# Altium footprint library MYLIB.PcbLib: 600 footprints (part 15 of 39)
Each footprint in its own frame and in the unit in brackets; x right, y up, seen from the top. Pads: shape width x height; smd on the part's side, far side on the other; paste and mask are expansions set on the pad; w line width, h text height; cw(c..) or ccw(c..) is an arc to the next point about the centre after c.
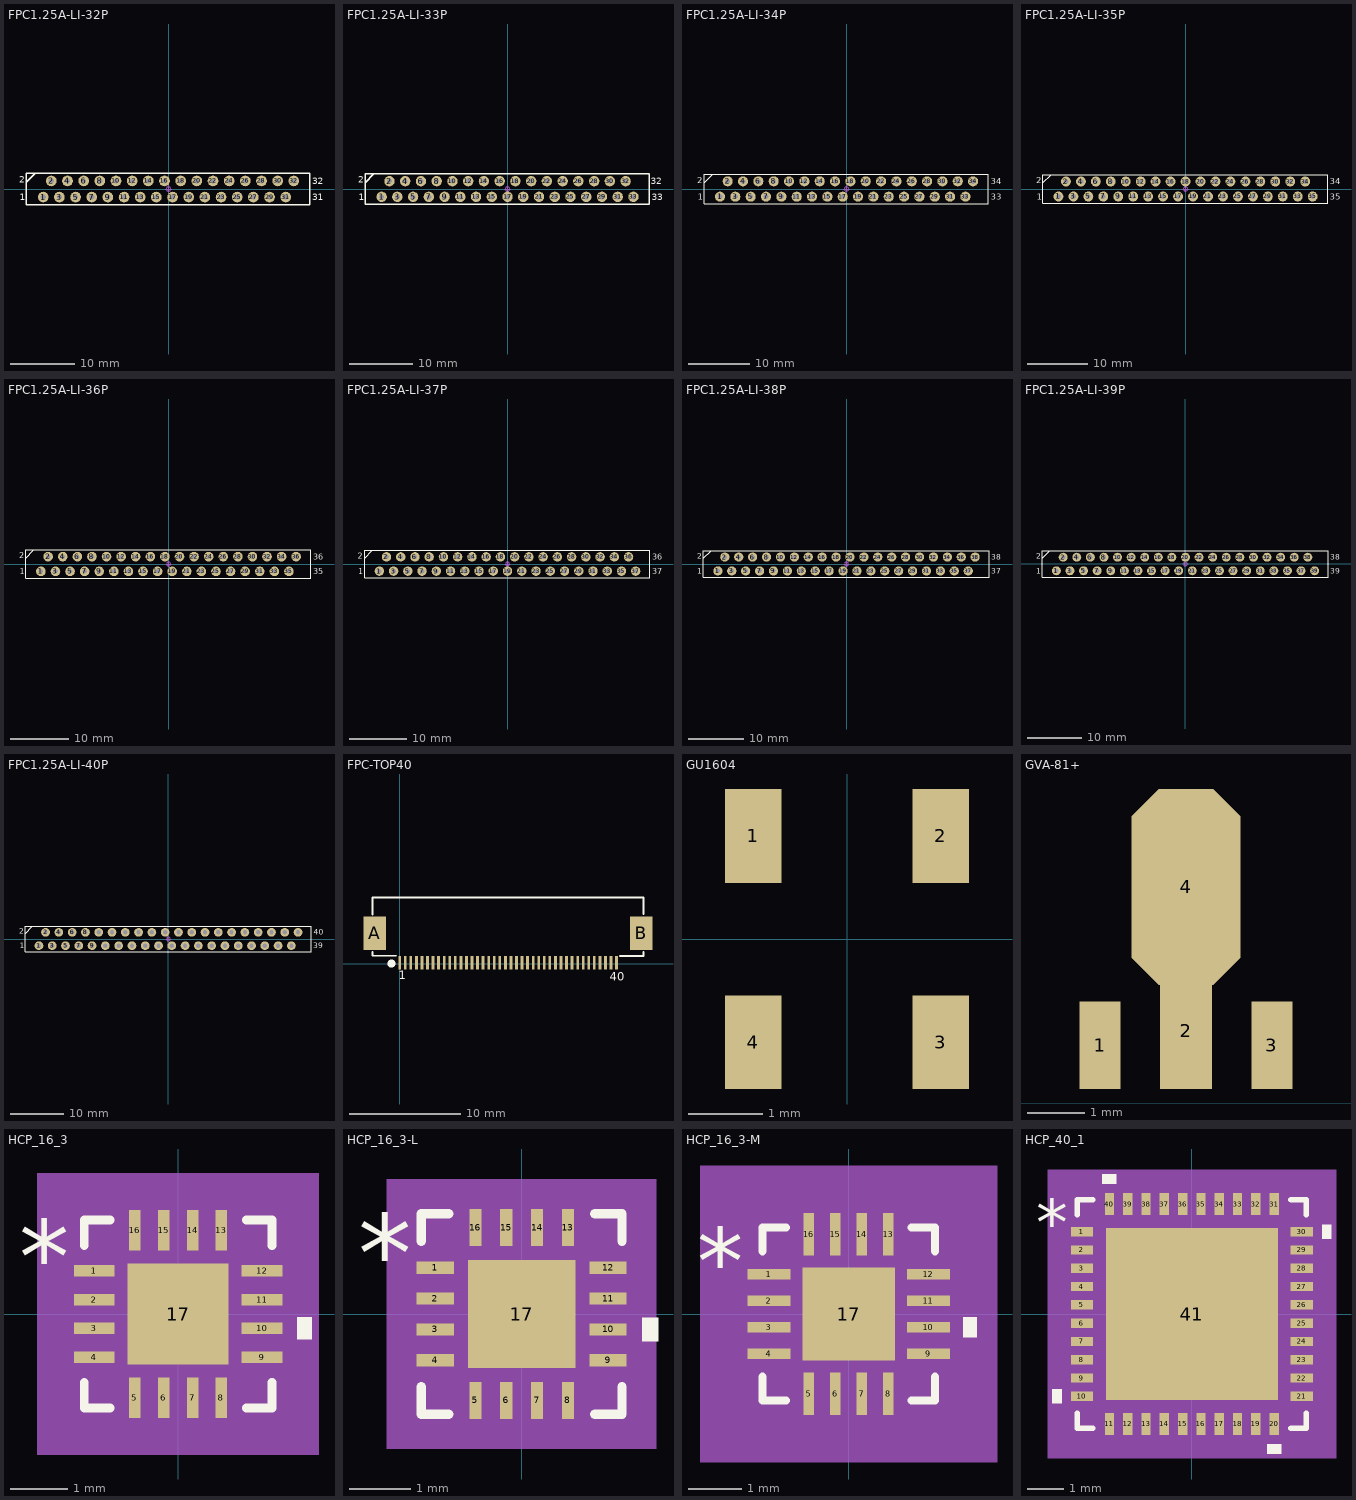
[diagram p14: the footprints below, top view; thin cyan lines are the x and y axes]

## FPC1.25A-LI-32P [mm] "32脚，长：43.5mm，宽：4.5mm，高：7.3mm"
pads (32):
  round 1.65 hole 0.8: 1(-19.375,-1.25) 2(-18.125,1.25) 3(-16.875,-1.25) 4(-15.625,1.25) 5(-14.375,-1.25) 6(-13.125,1.25) 7(-11.875,-1.25) 8(-10.625,1.25) 9(-9.375,-1.25) 10(-8.125,1.25) 11(-6.875,-1.25) 12(-5.625,1.25) 13(-4.375,-1.25) 14(-3.125,1.25) 15(-1.875,-1.25) 16(-0.625,1.25) 17(0.625,-1.25) 18(1.875,1.25) 19(3.125,-1.25) 20(4.375,1.25) 21(5.625,-1.25) 22(6.875,1.25) 23(8.125,-1.25) 24(9.375,1.25) 25(10.625,-1.25) 26(11.875,1.25) 27(13.125,-1.25) 28(14.375,1.25) 29(15.625,-1.25) 30(16.875,1.25) 31(18.125,-1.25) 32(19.375,1.25)
Top Overlay:
  lines w0.2: -21.981,1.016 -20.584,2.413 ; -21.981,-2.413 -21.981,2.413 21.875,2.413 21.875,-2.413 -21.981,-2.413
  text "31" at 22.256,-1.778 h1.02
  text "32" at 22.225,0.762 h1.02
  text "2" at -23.124,0.965 h1.02
  text "1" at -22.987,-1.778 h1.02
Mechanical 15:
  circle w0.05: c0,0 r0.35
  lines w0.05: -0.5,0 0.5,0 ; 0,-0.5 0,0.5
3D body "FPC1.25-DIP-32P.STEP": height 7.3, standoff -2.55, extent -21.8,-2.25 21.8,2.25

## FPC1.25A-LI-33P [mm] "33脚，长：44.75mm，宽：4.5mm，高：7.3mm"
pads (33):
  round 1.65 hole 0.8: 1(-20,-1.25) 2(-18.75,1.25) 3(-17.5,-1.25) 4(-16.25,1.25) 5(-15,-1.25) 6(-13.75,1.25) 7(-12.5,-1.25) 8(-11.25,1.25) 9(-10,-1.25) 10(-8.75,1.25) 11(-7.5,-1.25) 12(-6.25,1.25) 13(-5,-1.25) 14(-3.75,1.25) 15(-2.5,-1.25) 16(-1.25,1.25) 17(0,-1.25) 18(1.25,1.25) 19(2.5,-1.25) 20(3.75,1.25) 21(5,-1.25) 22(6.25,1.25) 23(7.5,-1.25) 24(8.75,1.25) 25(10,-1.25) 26(11.25,1.25) 27(12.5,-1.25) 28(13.75,1.25) 29(15,-1.25) 30(16.25,1.25) 31(17.5,-1.25) 32(18.75,1.25) 33(20,-1.25)
Top Overlay:
  lines w0.2: -22.606,1.016 -21.209,2.413 ; -22.606,-2.413 -22.606,2.413 22.5,2.413 22.5,-2.413 -22.606,-2.413
  text "33" at 22.881,-1.778 h1.02
  text "32" at 22.733,0.762 h1.02
  text "2" at -23.749,0.965 h1.02
  text "1" at -23.622,-1.778 h1.02
Mechanical 15:
  circle w0.05: c0,0 r0.35
  lines w0.05: -0.5,0 0.5,0 ; 0,-0.5 0,0.5
3D body "FPC1.25-DIP-33P.STEP": height 7.3, standoff -2.55, extent -22.425,-2.25 22.425,2.25

## FPC1.25A-LI-34P [mm] "34脚，长：46mm，宽：4.5mm，高：7.3mm"
pads (34):
  round 1.65 hole 0.8: 1(-20.625,-1.25) 2(-19.375,1.25) 3(-18.125,-1.25) 4(-16.875,1.25) 5(-15.625,-1.25) 6(-14.375,1.25) 7(-13.125,-1.25) 8(-11.875,1.25) 9(-10.625,-1.25) 10(-9.375,1.25) 11(-8.125,-1.25) 12(-6.875,1.25) 13(-5.625,-1.25) 14(-4.375,1.25) 15(-3.125,-1.25) 16(-1.875,1.25) 17(-0.625,-1.25) 18(0.625,1.25) 19(1.875,-1.25) 20(3.125,1.25) 21(4.375,-1.25) 22(5.625,1.25) 23(6.875,-1.25) 24(8.125,1.25) 25(9.375,-1.25) 26(10.625,1.25) 27(11.875,-1.25) 28(13.125,1.25) 29(14.375,-1.25) 30(15.625,1.25) 31(16.875,-1.25) 32(18.125,1.25) 33(19.375,-1.25) 34(20.625,1.25)
Top Overlay:
  lines w0.2: -23.231,1.016 -21.834,2.413 ; -23.231,-2.413 -23.231,2.413 23.125,2.413 23.125,-2.413 -23.231,-2.413
  text "33" at 23.506,-1.778 h1.02
  text "34" at 23.495,0.762 h1.02
  text "2" at -24.374,0.965 h1.02
  text "1" at -24.257,-1.778 h1.02
Mechanical 15:
  circle w0.05: c0,0 r0.35
  lines w0.05: -0.5,0 0.5,0 ; 0,-0.5 0,0.5
3D body "FPC1.25-DIP-34P.STEP": height 7.3, standoff -2.55, extent -23.05,-2.25 23.05,2.25

## FPC1.25A-LI-35P [mm] "35脚，长：47.25mm，宽：4.5mm，高：7.3mm"
pads (35):
  round 1.65 hole 0.8: 1(-21.25,-1.25) 2(-20,1.25) 3(-18.75,-1.25) 4(-17.5,1.25) 5(-16.25,-1.25) 6(-15,1.25) 7(-13.75,-1.25) 8(-12.5,1.25) 9(-11.25,-1.25) 10(-10,1.25) 11(-8.75,-1.25) 12(-7.5,1.25) 13(-6.25,-1.25) 14(-5,1.25) 15(-3.75,-1.25) 16(-2.5,1.25) 17(-1.25,-1.25) 18(0,1.25) 19(1.25,-1.25) 20(2.5,1.25) 21(3.75,-1.25) 22(5,1.25) 23(6.25,-1.25) 24(7.5,1.25) 25(8.75,-1.25) 26(10,1.25) 27(11.25,-1.25) 28(12.5,1.25) 29(13.75,-1.25) 30(15,1.25) 31(16.25,-1.25) 32(17.5,1.25) 33(18.75,-1.25) 34(20,1.25) 35(21.25,-1.25)
Top Overlay:
  lines w0.2: -23.856,1.016 -22.459,2.413 ; -23.856,-2.413 23.75,-2.413 23.75,2.413 -23.856,2.413 -23.856,-2.413
  text "1" at -24.892,-1.778 h1.02
  text "2" at -24.999,0.965 h1.02
  text "34" at 24.13,0.762 h1.02
  text "35" at 24.131,-1.778 h1.02
Mechanical 15:
  circle w0.05: c0,0 r0.35
  lines w0.05: -0.5,0 0.5,0 ; 0,-0.5 0,0.5
3D body "FPC1.25-DIP-35P.STEP": height 7.3, standoff -2.55, extent -23.675,-2.25 23.675,2.25

## FPC1.25A-LI-36P [mm] "36脚，长：48.5mm，宽：4.5mm，高：7.3mm"
pads (36):
  round 1.65 hole 0.8: 1(-21.875,-1.25) 2(-20.625,1.25) 3(-19.375,-1.25) 4(-18.125,1.25) 5(-16.875,-1.25) 6(-15.625,1.25) 7(-14.375,-1.25) 8(-13.125,1.25) 9(-11.875,-1.25) 10(-10.625,1.25) 11(-9.375,-1.25) 12(-8.125,1.25) 13(-6.875,-1.25) 14(-5.625,1.25) 15(-4.375,-1.25) 16(-3.125,1.25) 17(-1.875,-1.25) 18(-0.625,1.25) 19(0.625,-1.25) 20(1.875,1.25) 21(3.125,-1.25) 22(4.375,1.25) 23(5.625,-1.25) 24(6.875,1.25) 25(8.125,-1.25) 26(9.375,1.25) 27(10.625,-1.25) 28(11.875,1.25) 29(13.125,-1.25) 30(14.375,1.25) 31(15.625,-1.25) 32(16.875,1.25) 33(18.125,-1.25) 34(19.375,1.25) 35(20.625,-1.25) 36(21.875,1.25)
Top Overlay:
  lines w0.2: -24.481,1.016 -23.084,2.413 ; -24.481,-2.413 24.375,-2.413 24.375,2.413 -24.481,2.413 -24.481,-2.413
  text "1" at -25.527,-1.778 h1.02
  text "2" at -25.624,0.965 h1.02
  text "36" at 24.765,0.762 h1.02
  text "35" at 24.756,-1.778 h1.02
Mechanical 15:
  circle w0.05: c0,0 r0.35
  lines w0.05: -0.5,0 0.5,0 ; 0,-0.5 0,0.5
3D body "FPC1.25-DIP-36P.STEP": height 7.3, standoff -2.55, extent -24.3,-2.25 24.3,2.25

## FPC1.25A-LI-37P [mm] "37脚，长：48.75mm，宽：4.5mm，高：7.3mm"
pads (37):
  round 1.65 hole 0.8: 1(-22.5,-1.25) 2(-21.25,1.25) 3(-20,-1.25) 4(-18.75,1.25) 5(-17.5,-1.25) 6(-16.25,1.25) 7(-15,-1.25) 8(-13.75,1.25) 9(-12.5,-1.25) 10(-11.25,1.25) 11(-10,-1.25) 12(-8.75,1.25) 13(-7.5,-1.25) 14(-6.25,1.25) 15(-5,-1.25) 16(-3.75,1.25) 17(-2.5,-1.25) 18(-1.25,1.25) 19(0,-1.25) 20(1.25,1.25) 21(2.5,-1.25) 22(3.75,1.25) 23(5,-1.25) 24(6.25,1.25) 25(7.5,-1.25) 26(8.75,1.25) 27(10,-1.25) 28(11.25,1.25) 29(12.5,-1.25) 30(13.75,1.25) 31(15,-1.25) 32(16.25,1.25) 33(17.5,-1.25) 34(18.75,1.25) 35(20,-1.25) 36(21.25,1.25) 37(22.5,-1.25)
Top Overlay:
  lines w0.2: -25.106,1.016 -23.709,2.413 ; -25.106,-2.413 25,-2.413 25,2.413 -25.106,2.413 -25.106,-2.413
  text "1" at -26.162,-1.778 h1.02
  text "2" at -26.249,0.965 h1.02
  text "36" at 25.4,0.762 h1.02
  text "37" at 25.381,-1.778 h1.02
Mechanical 15:
  circle w0.05: c0,0 r0.35
  lines w0.05: -0.5,0 0.5,0 ; 0,-0.5 0,0.5
3D body "FPC1.25-DIP-37P.STEP": height 7.3, standoff -2.55, extent -24.925,-2.25 24.925,2.25

## FPC1.25A-LI-38P [mm] "38脚，长：51mm，宽：4.5mm，高：7.3mm"
pads (38):
  round 1.65 hole 0.8: 1(-23.125,-1.25) 2(-21.875,1.25) 3(-20.625,-1.25) 4(-19.375,1.25) 5(-18.125,-1.25) 6(-16.875,1.25) 7(-15.625,-1.25) 8(-14.375,1.25) 9(-13.125,-1.25) 10(-11.875,1.25) 11(-10.625,-1.25) 12(-9.375,1.25) 13(-8.125,-1.25) 14(-6.875,1.25) 15(-5.625,-1.25) 16(-4.375,1.25) 17(-3.125,-1.25) 18(-1.875,1.25) 19(-0.625,-1.25) 20(0.625,1.25) 21(1.875,-1.25) 22(3.125,1.25) 23(4.375,-1.25) 24(5.625,1.25) 25(6.875,-1.25) 26(8.125,1.25) 27(9.375,-1.25) 28(10.625,1.25) 29(11.875,-1.25) 30(13.125,1.25) 31(14.375,-1.25) 32(15.625,1.25) 33(16.875,-1.25) 34(18.125,1.25) 35(19.375,-1.25) 36(20.625,1.25) 37(21.875,-1.25) 38(23.125,1.25)
Top Overlay:
  lines w0.2: -25.731,1.016 -24.334,2.413 ; -25.731,-2.413 25.625,-2.413 25.625,2.413 -25.731,2.413 -25.731,-2.413
  text "1" at -26.797,-1.778 h1.02
  text "2" at -26.874,0.965 h1.02
  text "38" at 26.035,0.762 h1.02
  text "37" at 26.006,-1.778 h1.02
Mechanical 15:
  circle w0.05: c0,0 r0.35
  lines w0.05: -0.5,0 0.5,0 ; 0,-0.5 0,0.5
3D body "FPC1.25-DIP-38P.STEP": height 7.3, standoff -2.55, extent -25.55,-2.25 25.55,2.25

## FPC1.25A-LI-39P [mm] "39脚，长：52.5mm，宽：4.5mm，高：7.3mm"
pads (39):
  round 1.65 hole 0.8: 1(-23.75,-1.25) 2(-22.5,1.25) 3(-21.25,-1.25) 4(-20,1.25) 5(-18.75,-1.25) 6(-17.5,1.25) 7(-16.25,-1.25) 8(-15,1.25) 9(-13.75,-1.25) 10(-12.5,1.25) 11(-11.25,-1.25) 12(-10,1.25) 13(-8.75,-1.25) 14(-7.5,1.25) 15(-6.25,-1.25) 16(-5,1.25) 17(-3.75,-1.25) 18(-2.5,1.25) 19(-1.25,-1.25) 20(0,1.25) 21(1.25,-1.25) 22(2.5,1.25) 23(3.75,-1.25) 24(5,1.25) 25(6.25,-1.25) 26(7.5,1.25) 27(8.75,-1.25) 28(10,1.25) 29(11.25,-1.25) 30(12.5,1.25) 31(13.75,-1.25) 32(15,1.25) 33(16.25,-1.25) 34(17.5,1.25) 35(18.75,-1.25) 36(20,1.25) 37(21.25,-1.25) 38(22.5,1.25) 39(23.75,-1.25)
Top Overlay:
  lines w0.2: -26.356,1.016 -24.959,2.413 ; -26.356,-2.413 26.25,-2.413 26.25,2.413 -26.356,2.413 -26.356,-2.413
  text "1" at -27.432,-1.778 h1.02
  text "2" at -27.499,0.965 h1.02
  text "38" at 26.67,0.762 h1.02
  text "39" at 26.631,-1.778 h1.02
Mechanical 15:
  circle w0.05: c0,0 r0.35
  lines w0.05: -0.5,0 0.5,0 ; 0,-0.5 0,0.5
3D body "FPC1.25-DIP-39P.STEP": height 7.3, standoff -2.55, extent -26.175,-2.25 26.175,2.25

## FPC1.25A-LI-40P [mm] "40脚，长：53.5mm，宽：4.5mm，高：7.3mm"
pads (40):
  round 1.65 hole 0.8: 1(-24.375,-1.25) 2(-23.125,1.25) 3(-21.875,-1.25) 4(-20.625,1.25) 5(-19.375,-1.25) 6(-18.125,1.25) 7(-16.875,-1.25) 8(-15.625,1.25) 9(-14.375,-1.25) 10(-13.125,1.25) 11(-11.875,-1.25) 12(-10.625,1.25) 13(-9.375,-1.25) 14(-8.125,1.25) 15(-6.875,-1.25) 16(-5.625,1.25) 17(-4.375,-1.25) 18(-3.125,1.25) 19(-1.875,-1.25) 20(-0.625,1.25) 21(0.625,-1.25) 22(1.875,1.25) 23(3.125,-1.25) 24(4.375,1.25) 25(5.625,-1.25) 26(6.875,1.25) 27(8.125,-1.25) 28(9.375,1.25) 29(10.625,-1.25) 30(11.875,1.25) 31(13.125,-1.25) 32(14.375,1.25) 33(15.625,-1.25) 34(16.875,1.25) 35(18.125,-1.25) 36(19.375,1.25) 37(20.625,-1.25) 38(21.875,1.25) 39(23.125,-1.25) 40(24.375,1.25)
Top Overlay:
  lines w0.2: -26.981,1.016 -25.584,2.413 ; -26.981,-2.413 26.875,-2.413 26.875,2.413 -26.981,2.413 -26.981,-2.413
  text "1" at -27.94,-1.778 h1.02
  text "2" at -28.124,0.965 h1.02
  text "40" at 27.305,0.762 h1.02
  text "39" at 27.256,-1.778 h1.02
Mechanical 15:
  circle w0.05: c0,0 r0.35
  lines w0.05: -0.5,0 0.5,0 ; 0,-0.5 0,0.5
3D body "FPC1.25-DIP-40P.STEP": height 7.3, standoff -2.55, extent -26.8,-2.25 26.8,2.25

## FPC-TOP40 [mm]
pads (42):
  rect 0.25x1.2 smd: 1(0,0.102) 2(0.5,0.102) 3(1,0.102) 4(1.5,0.102) 5(2,0.102) 6(2.5,0.102) 7(3,0.102) 8(3.5,0.102) 9(4,0.102) 10(4.5,0.102) 11(5,0.102) 12(5.5,0.102) 13(6,0.102) 14(6.5,0.102) 15(7,0.102) 16(7.5,0.102) 17(8,0.102) 18(8.5,0.102) 19(9,0.102) 20(9.5,0.102) 21(10,0.102) 22(10.5,0.102) 23(11,0.102) 24(11.5,0.102) 25(12,0.102) 26(12.5,0.102) 27(13,0.102) 28(13.5,0.102) 29(14,0.102) 30(14.5,0.102) 31(15,0.102) 32(15.5,0.102) 33(16,0.102) 34(16.5,0.102) 35(17,0.102) 36(17.5,0.102) 37(18,0.102) 38(18.5,0.102) 39(19,0.102) 40(19.5,0.102)
  rect 2x3 smd: A(-2.25,2.754) B(21.725,2.754)
Top Overlay:
  circle w0.356: c-0.737,0.025 r0.178
  lines w0.127: -2.45,0.731 -2.438,0.719
  lines w0.152: -2.45,0.719 -0.305,0.719 ; -2.45,0.731 -2.45,1.067 ; -2.45,4.445 -2.45,5.969 21.925,5.969 21.925,4.47 ; 19.794,0.711 21.925,0.711 21.925,1.067
  text "40" at 18.898,-1.499 h0.76
  text "1" at -0.102,-1.397 h0.76

## GU1604 [mil]
pads (4):
  rect 30x50 smd: 1(-50,55) 2(50,55) 3(50,-55) 4(-50,-55)

## GVA-81+ [mil] "5V"
height 62.99
pads (4):
  rect 28x60 smd: 1(80,40) 3(198,40)
  rect 36x80 smd: 2(139,50)
  oct 75x134.5 smd: 4(139,148.62)

## HCP_16_3 [mm]
pads (17):
  rect 0.705x0.198 smd paste+0 mask+0: 1(-1.452,0.75) 2(-1.452,0.25) 3(-1.452,-0.25) 4(-1.452,-0.75) 9(1.452,-0.75) 10(1.452,-0.25) 11(1.452,0.25) 12(1.452,0.75)
  rect 0.198x0.705 smd paste+0 mask+0: 5(-0.75,-1.452) 6(-0.25,-1.452) 7(0.25,-1.452) 8(0.75,-1.452) 13(0.75,1.452) 14(0.25,1.452) 15(-0.25,1.452) 16(-0.75,1.452)
  rect 1.75x1.75 smd paste-0.862 mask+0: 17(0,0)
Top Overlay:
  region: 2.059,-0.059 2.313,-0.059 2.313,-0.44 2.059,-0.44
  lines w0.152: -1.627,-1.182 -1.627,-1.627 -1.182,-1.627 ; -1.627,1.182 -1.627,1.627 -1.182,1.627 ; 1.182,-1.627 1.627,-1.627 1.627,-1.182 ; 1.182,1.627 1.627,1.627 1.627,1.182
  text "*" at -2.757,0.365 h1.27
Top Paste:
  region: 0.875,0.875 -0.875,0.875 -0.875,-0.875 0.875,-0.875
Mechanical 5:
  region: 2.44,-2.44 -2.44,-2.44 -2.44,2.44 2.44,2.44
Mechanical 13:
  lines w0.025: -1.5,0.23 -0.23,1.5 ; -1.5,-1.5 -1.5,1.5 1.5,1.5 1.5,-1.5 -1.5,-1.5 ; -1.5,-0.9 -1.5,-0.6 -1.5,-0.9 ; -1.5,-0.4 -1.5,-0.1 -1.5,-0.4 ; -1.5,0.1 -1.5,0.4 -1.5,0.1 ; -1.5,0.6 -1.5,0.9 -1.5,0.6 ; -0.9,-1.5 -0.6,-1.5 -0.9,-1.5 ; -0.9,1.5 -0.6,1.5 -0.9,1.5 ; -0.4,-1.5 -0.1,-1.5 -0.4,-1.5 ; -0.4,1.5 -0.1,1.5 -0.4,1.5 ; 0.1,-1.5 0.4,-1.5 0.1,-1.5 ; 0.1,1.5 0.4,1.5 0.1,1.5 ; 0.6,-1.5 0.9,-1.5 0.6,-1.5 ; 0.6,1.5 0.9,1.5 0.6,1.5 ; 1.5,-0.9 1.5,-0.6 1.5,-0.9 ; 1.5,-0.4 1.5,-0.1 1.5,-0.4 ; 1.5,0.1 1.5,0.4 1.5,0.1 ; 1.5,0.6 1.5,0.9 1.5,0.6
  text "*" at -1.418,0.365 h1.27
Mechanical 15:
  region: -1.103,-1.754 -1.754,-1.754 -1.754,-1.103 -2.059,-1.103 -2.059,1.103 -1.754,1.103 -1.754,1.754 -1.103,1.754 -1.103,2.059 1.103,2.059 1.103,1.754 1.754,1.754 1.754,1.103 2.059,1.103 2.059,-1.103 1.754,-1.103 1.754,-1.754 1.103,-1.754 1.103,-2.059 -1.103,-2.059
  lines w0.152: -2.059,-1.103 -2.059,1.103 -1.754,1.103 -1.754,1.754 -1.103,1.754 -1.103,2.059 1.103,2.059 1.103,1.754 1.754,1.754 1.754,1.103 2.059,1.103 2.059,-1.103 1.754,-1.103 1.754,-1.754 1.103,-1.754 1.103,-2.059 -1.103,-2.059 -1.103,-1.754 -1.754,-1.754 -1.754,-1.103 -2.059,-1.103
3D body: height 0.25, standoff 0, extent 0,0 0.254,0.254

## HCP_16_3-L [mm]
pads (17):
  rect 0.603x0.198 smd paste+0 mask+0: 1(-1.402,0.75) 2(-1.402,0.25) 3(-1.402,-0.25) 4(-1.402,-0.75) 9(1.402,-0.75) 10(1.402,-0.25) 11(1.402,0.25) 12(1.402,0.75)
  rect 0.198x0.603 smd paste+0 mask+0: 5(-0.75,-1.402) 6(-0.25,-1.402) 7(0.25,-1.402) 8(0.75,-1.402) 13(0.75,1.402) 14(0.25,1.402) 15(-0.25,1.402) 16(-0.75,1.402)
  rect 1.75x1.75 smd paste-0.862 mask+0: 17(0,0)
Top Overlay:
  region: 1.957,-0.059 2.211,-0.059 2.211,-0.44 1.957,-0.44
  lines w0.152: -1.627,-1.182 -1.627,-1.627 -1.182,-1.627 ; -1.627,1.182 -1.627,1.627 -1.182,1.627 ; 1.182,-1.627 1.627,-1.627 1.627,-1.182 ; 1.182,1.627 1.627,1.627 1.627,1.182
  text "*" at -2.656,0.365 h1.27
Top Paste:
  region: 0.875,0.875 -0.875,0.875 -0.875,-0.875 0.875,-0.875
Mechanical 5:
  region: 2.186,-2.186 -2.186,-2.186 -2.186,2.186 2.186,2.186
Mechanical 13:
  lines w0.025: -1.5,0.23 -0.23,1.5 ; -1.5,-1.5 -1.5,1.5 1.5,1.5 1.5,-1.5 -1.5,-1.5 ; -1.5,-0.9 -1.5,-0.6 -1.5,-0.9 ; -1.5,-0.4 -1.5,-0.1 -1.5,-0.4 ; -1.5,0.1 -1.5,0.4 -1.5,0.1 ; -1.5,0.6 -1.5,0.9 -1.5,0.6 ; -0.9,-1.5 -0.6,-1.5 -0.9,-1.5 ; -0.9,1.5 -0.6,1.5 -0.9,1.5 ; -0.4,-1.5 -0.1,-1.5 -0.4,-1.5 ; -0.4,1.5 -0.1,1.5 -0.4,1.5 ; 0.1,-1.5 0.4,-1.5 0.1,-1.5 ; 0.1,1.5 0.4,1.5 0.1,1.5 ; 0.6,-1.5 0.9,-1.5 0.6,-1.5 ; 0.6,1.5 0.9,1.5 0.6,1.5 ; 1.5,-0.9 1.5,-0.6 1.5,-0.9 ; 1.5,-0.4 1.5,-0.1 1.5,-0.4 ; 1.5,0.1 1.5,0.4 1.5,0.1 ; 1.5,0.6 1.5,0.9 1.5,0.6
  text "*" at -1.418,0.365 h1.27
Mechanical 15:
  region: -0.951,-1.602 -1.602,-1.602 -1.602,-0.951 -1.805,-0.951 -1.805,0.951 -1.602,0.951 -1.602,1.602 -0.951,1.602 -0.951,1.805 0.951,1.805 0.951,1.602 1.602,1.602 1.602,0.951 1.805,0.951 1.805,-0.951 1.602,-0.951 1.602,-1.602 0.951,-1.602 0.951,-1.805 -0.951,-1.805
  lines w0.152: -1.805,-0.951 -1.805,0.951 -1.602,0.951 -1.602,1.602 -0.951,1.602 -0.951,1.805 0.951,1.805 0.951,1.602 1.602,1.602 1.602,0.951 1.805,0.951 1.805,-0.951 1.602,-0.951 1.602,-1.602 0.951,-1.602 0.951,-1.805 -0.951,-1.805 -0.951,-1.602 -1.602,-1.602 -1.602,-0.951 -1.805,-0.951
3D body: height 0.25, standoff 0, extent 0,0 0.254,0.254

## HCP_16_3-M [mm]
pads (17):
  rect 0.806x0.198 smd paste+0 mask+0: 1(-1.503,0.75) 2(-1.503,0.25) 3(-1.503,-0.25) 4(-1.503,-0.75) 9(1.503,-0.75) 10(1.503,-0.25) 11(1.503,0.25) 12(1.503,0.75)
  rect 0.198x0.806 smd paste+0 mask+0: 5(-0.75,-1.503) 6(-0.25,-1.503) 7(0.25,-1.503) 8(0.75,-1.503) 13(0.75,1.503) 14(0.25,1.503) 15(-0.25,1.503) 16(-0.75,1.503)
  rect 1.75x1.75 smd paste-0.862 mask+0: 17(0,0)
Top Overlay:
  region: 2.16,-0.059 2.414,-0.059 2.414,-0.44 2.16,-0.44
  lines w0.152: -1.627,-1.182 -1.627,-1.627 -1.182,-1.627 ; -1.627,1.182 -1.627,1.627 -1.182,1.627 ; 1.182,-1.627 1.627,-1.627 1.627,-1.182 ; 1.182,1.627 1.627,1.627 1.627,1.182
  text "*" at -2.859,0.365 h1.27
Top Paste:
  region: 0.875,0.875 -0.875,0.875 -0.875,-0.875 0.875,-0.875
Mechanical 5:
  region: 2.795,-2.795 -2.795,-2.795 -2.795,2.795 2.795,2.795
Mechanical 13:
  lines w0.025: -1.5,0.23 -0.23,1.5 ; -1.5,-1.5 1.5,-1.5 1.5,1.5 -1.5,1.5 -1.5,-1.5 ; -1.5,-0.9 -1.5,-0.6 -1.5,-0.9 ; -1.5,-0.4 -1.5,-0.1 -1.5,-0.4 ; -1.5,0.1 -1.5,0.4 -1.5,0.1 ; -1.5,0.6 -1.5,0.9 -1.5,0.6 ; -0.9,-1.5 -0.6,-1.5 -0.9,-1.5 ; -0.9,1.5 -0.6,1.5 -0.9,1.5 ; -0.4,-1.5 -0.1,-1.5 -0.4,-1.5 ; -0.4,1.5 -0.1,1.5 -0.4,1.5 ; 0.1,-1.5 0.4,-1.5 0.1,-1.5 ; 0.1,1.5 0.4,1.5 0.1,1.5 ; 0.6,-1.5 0.9,-1.5 0.6,-1.5 ; 0.6,1.5 0.9,1.5 0.6,1.5 ; 1.5,-0.9 1.5,-0.6 1.5,-0.9 ; 1.5,-0.4 1.5,-0.1 1.5,-0.4 ; 1.5,0.1 1.5,0.4 1.5,0.1 ; 1.5,0.6 1.5,0.9 1.5,0.6
  text "*" at -1.418,0.365 h1.27
Mechanical 15:
  region: -1.357,-2.008 -2.008,-2.008 -2.008,-1.357 -2.414,-1.357 -2.414,1.357 -2.008,1.357 -2.008,2.008 -1.357,2.008 -1.357,2.414 1.357,2.414 1.357,2.008 2.008,2.008 2.008,1.357 2.414,1.357 2.414,-1.357 2.008,-1.357 2.008,-2.008 1.357,-2.008 1.357,-2.414 -1.357,-2.414
  lines w0.152: -2.414,-1.357 -2.008,-1.357 -2.008,-2.008 -1.357,-2.008 -1.357,-2.414 1.357,-2.414 1.357,-2.008 2.008,-2.008 2.008,-1.357 2.414,-1.357 2.414,1.357 2.008,1.357 2.008,2.008 1.357,2.008 1.357,2.414 -1.357,2.414 -1.357,2.008 -2.008,2.008 -2.008,1.357 -2.414,1.357 -2.414,-1.357
3D body: height 0.25, standoff 0, extent 0,0 0.254,0.254

## HCP_40_1 [mm]
pads (41):
  rect 0.605x0.254 smd paste+0 mask+0: 1(-3.002,2.25) 2(-3.002,1.75) 3(-3.002,1.25) 4(-3.002,0.75) 5(-3.002,0.25) 6(-3.002,-0.25) 7(-3.002,-0.75) 8(-3.002,-1.25) 9(-3.002,-1.75) 10(-3.002,-2.25) 21(3.002,-2.25) 22(3.002,-1.75) 23(3.002,-1.25) 24(3.002,-0.75) 25(3.002,-0.25) 26(3.002,0.25) 27(3.002,0.75) 28(3.002,1.25) 29(3.002,1.75) 30(3.002,2.25)
  rect 0.254x0.605 smd paste+0 mask+0: 11(-2.25,-3.002) 12(-1.75,-3.002) 13(-1.25,-3.002) 14(-0.75,-3.002) 15(-0.25,-3.002) 16(0.25,-3.002) 17(0.75,-3.002) 18(1.25,-3.002) 19(1.75,-3.002) 20(2.25,-3.002) 31(2.25,3.002) 32(1.75,3.002) 33(1.25,3.002) 34(0.75,3.002) 35(0.25,3.002) 36(-0.25,3.002) 37(-0.75,3.002) 38(-1.25,3.002) 39(-1.75,3.002) 40(-2.25,3.002)
  rect 4.7x4.7 smd paste-2.337 mask+0: 41(0,0)
Top Overlay:
  region: -2.06,3.559 -2.441,3.559 -2.441,3.813 -2.06,3.813
  region: 3.559,2.441 3.813,2.441 3.813,2.06 3.559,2.06
  region: 2.441,-3.559 2.06,-3.559 2.06,-3.813 2.441,-3.813
  region: -3.559,-2.06 -3.813,-2.06 -3.813,-2.441 -3.559,-2.441
  lines w0.152: -3.127,-2.71 -3.127,-3.127 -2.71,-3.127 ; -3.127,2.71 -3.127,3.127 -2.71,3.127 ; 2.71,-3.127 3.127,-3.127 3.127,-2.71 ; 2.71,3.127 3.127,3.127 3.127,2.71
  text "*" at -4.257,1.865 h1.27
Top Paste:
  region: 2.25,-0.883 0.883,-0.883 0.883,-2.25 2.25,-2.25
  region: 2.25,0.683 0.883,0.683 0.883,-0.683 2.25,-0.683
  region: 2.25,2.25 0.883,2.25 0.883,0.883 2.25,0.883
  region: 0.683,-0.883 -0.683,-0.883 -0.683,-2.25 0.683,-2.25
  region: 0.683,0.683 -0.683,0.683 -0.683,-0.683 0.683,-0.683
  region: 0.683,2.25 -0.683,2.25 -0.683,0.883 0.683,0.883
  region: -0.883,-0.883 -2.25,-0.883 -2.25,-2.25 -0.883,-2.25
  region: -0.883,0.683 -2.25,0.683 -2.25,-0.683 -0.883,-0.683
  region: -0.883,2.25 -2.25,2.25 -2.25,0.883 -0.883,0.883
Mechanical 5:
  region: 3.94,-3.94 -3.94,-3.94 -3.94,3.94 3.94,3.94
Mechanical 13:
  lines w0.025: -3,1.73 -1.73,3 ; -3,-3 -3,3 3,3 3,-3 -3,-3 ; -3,-2.402 -3,-2.098 -3,-2.402 ; -3,-1.902 -3,-1.598 -3,-1.902 ; -3,-1.402 -3,-1.098 -3,-1.402 ; -3,-0.902 -3,-0.598 -3,-0.902 ; -3,-0.402 -3,-0.098 -3,-0.402 ; -3,0.098 -3,0.402 -3,0.098 ; -3,0.598 -3,0.902 -3,0.598 ; -3,1.098 -3,1.402 -3,1.098 ; -3,1.598 -3,1.902 -3,1.598 ; -3,2.098 -3,2.402 -3,2.098 ; -2.402,-3 -2.098,-3 -2.402,-3 ; -2.402,3 -2.098,3 -2.402,3 ; -1.902,-3 -1.598,-3 -1.902,-3 ; -1.902,3 -1.598,3 -1.902,3 ; -1.402,-3 -1.098,-3 -1.402,-3 ; -1.402,3 -1.098,3 -1.402,3 ; -0.902,-3 -0.598,-3 -0.902,-3 ; -0.902,3 -0.598,3 -0.902,3 ; -0.402,-3 -0.098,-3 -0.402,-3 ; -0.402,3 -0.098,3 -0.402,3 ; 0.098,-3 0.402,-3 0.098,-3 ; 0.098,3 0.402,3 0.098,3 ; 0.598,-3 0.902,-3 0.598,-3 ; 0.598,3 0.902,3 0.598,3 ; 1.098,-3 1.402,-3 1.098,-3 ; 1.098,3 1.402,3 1.098,3 ; 1.598,-3 1.902,-3 1.598,-3 ; 1.598,3 1.902,3 1.598,3 ; 2.098,-3 2.402,-3 2.098,-3 ; 2.098,3 2.402,3 2.098,3 ; 3,-2.402 3,-2.098 3,-2.402 ; 3,-1.902 3,-1.598 3,-1.902 ; 3,-1.402 3,-1.098 3,-1.402 ; 3,-0.902 3,-0.598 3,-0.902 ; 3,-0.402 3,-0.098 3,-0.402 ; 3,0.098 3,0.402 3,0.098 ; 3,0.598 3,0.902 3,0.598 ; 3,1.098 3,1.402 3,1.098 ; 3,1.598 3,1.902 3,1.598 ; 3,2.098 3,2.402 3,2.098
  text "*" at -3.017,1.865 h1.27
Mechanical 15:
  region: -2.631,-3.254 -3.254,-3.254 -3.254,-2.631 -3.559,-2.631 -3.559,2.631 -3.254,2.631 -3.254,3.254 -2.631,3.254 -2.631,3.559 2.631,3.559 2.631,3.254 3.254,3.254 3.254,2.631 3.559,2.631 3.559,-2.631 3.254,-2.631 3.254,-3.254 2.631,-3.254 2.631,-3.559 -2.631,-3.559
  lines w0.152: -3.559,-2.631 -3.559,2.631 -3.254,2.631 -3.254,3.254 -2.631,3.254 -2.631,3.559 2.631,3.559 2.631,3.254 3.254,3.254 3.254,2.631 3.559,2.631 3.559,-2.631 3.254,-2.631 3.254,-3.254 2.631,-3.254 2.631,-3.559 -2.631,-3.559 -2.631,-3.254 -3.254,-3.254 -3.254,-2.631 -3.559,-2.631
3D body: height 0.25, standoff 0, extent 0,0 0.254,0.254